# Altium footprint library EPCOS.PcbLib: 178 footprints (part 5 of 12)
Each footprint in its own frame and in the unit in brackets; x right, y up, seen from the top. Pads: shape width x height; smd on the part's side, far side on the other; paste and mask are expansions set on the pad; w line width, h text height; cw(c..) or ccw(c..) is an arc to the next point about the centre after c.
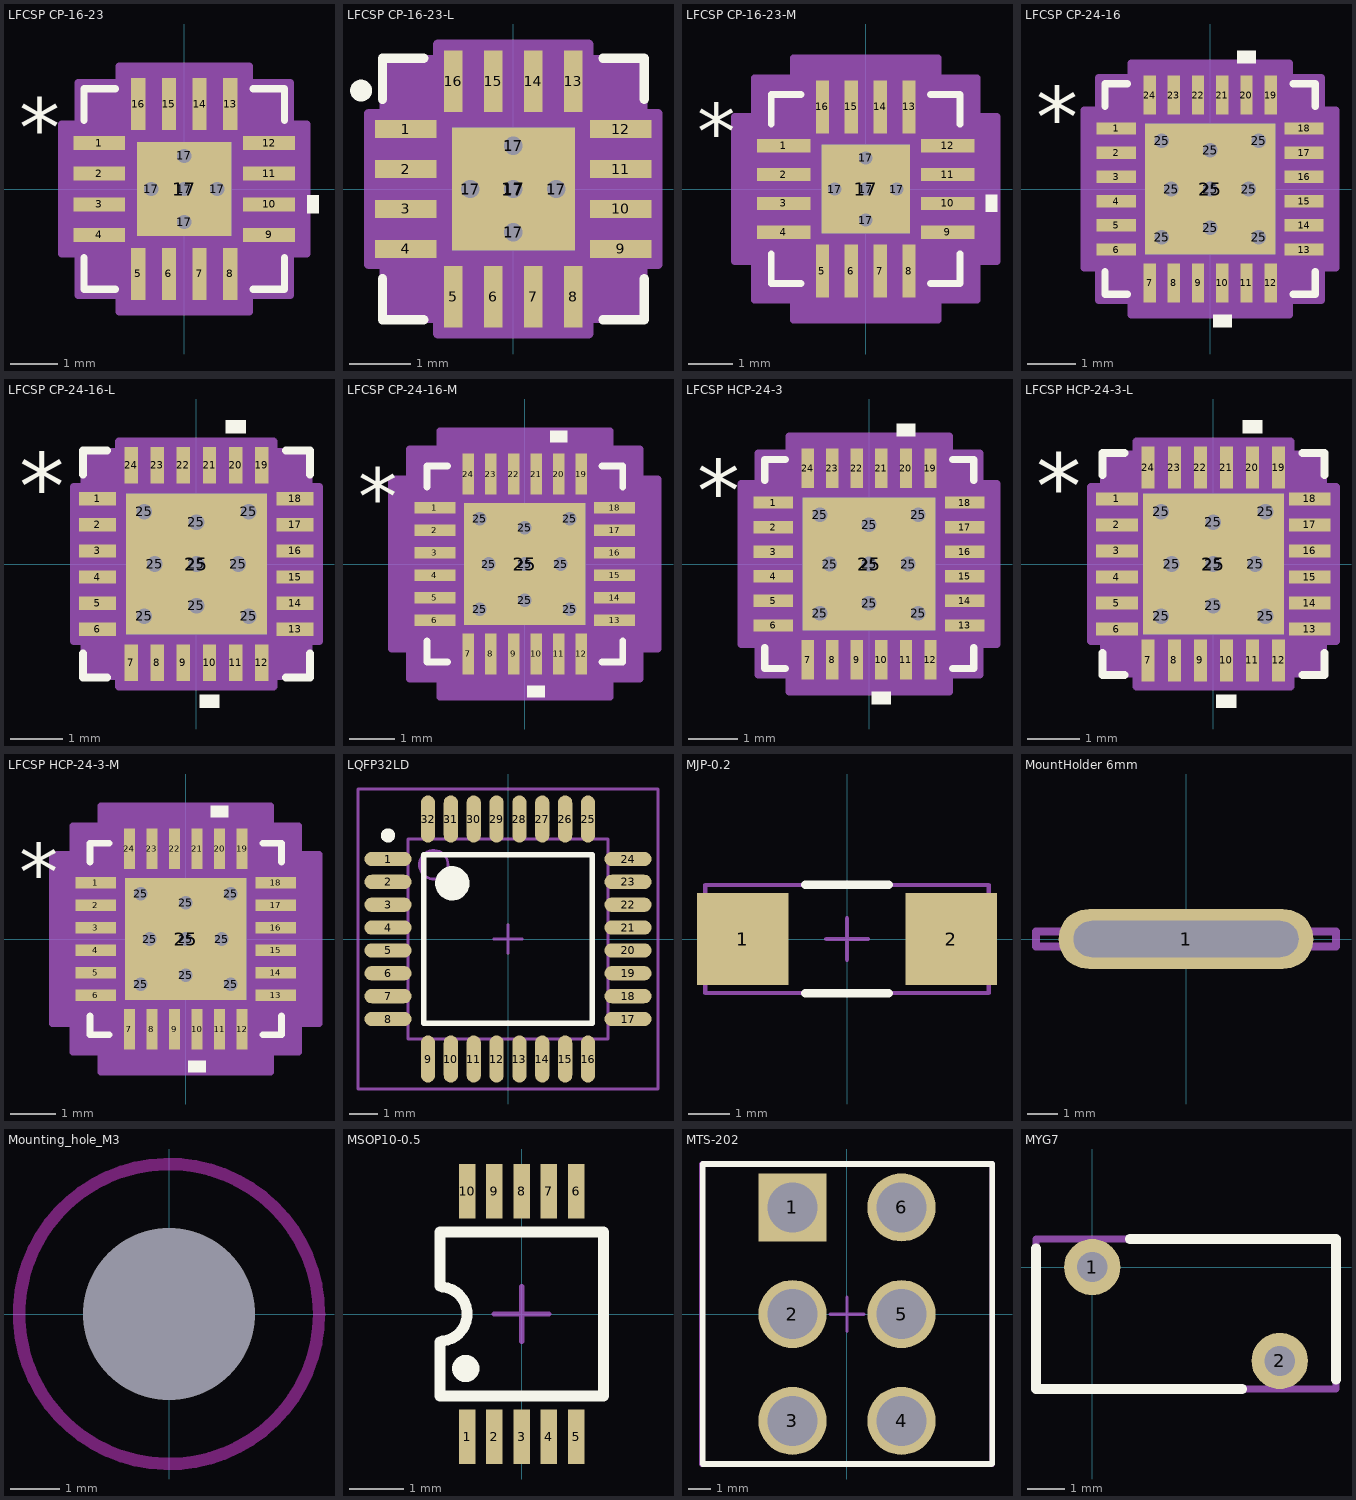
[diagram p4: the footprints below, top view; thin cyan lines are the x and y axes]

## LFCSP CP-16-23 [mm]
height 0.75
pads (22):
  rect 1.1x0.3 smd paste+0 mask+0: 1(-1.8,0.975) 2(-1.8,0.325) 3(-1.8,-0.325) 4(-1.8,-0.975) 9(1.8,-0.975) 10(1.8,-0.325) 11(1.8,0.325) 12(1.8,0.975)
  rect 0.3x1.1 smd paste+0 mask+0: 5(-0.975,-1.8) 6(-0.325,-1.8) 7(0.325,-1.8) 8(0.975,-1.8) 13(0.975,1.8) 14(0.325,1.8) 15(-0.325,1.8) 16(-0.975,1.8)
  round 0.4 hole 0.3 mask+0: 17(-0.7,0) 17(0,-0.7) 17(0,0) 17(0,0.7) 17(0.7,0)
  rect 2x2 smd paste+0 mask+0: 17(0,0)
Bottom Layer:
  rectangle: -1,-1 1,1
Top Overlay:
  region: 2.604,-0.135 2.858,-0.135 2.858,-0.516 2.604,-0.516
  lines w0.152: -2.127,-1.458 -2.127,-2.127 -1.458,-2.127 ; -2.127,1.458 -2.127,2.127 -1.458,2.127 ; 1.458,-2.127 2.127,-2.127 2.127,-1.458 ; 1.458,2.127 2.127,2.127 2.127,1.458
  text "*" at -3.502,0.665 h1.27
Mechanical 13:
  lines w0.025: -2,0.73 -0.73,2 ; -2.05,-1.15 -2.05,-0.8 -2,-0.8 -2,-1.15 -2.05,-1.15 ; -2.05,-0.5 -2.05,-0.15 -2,-0.15 -2,-0.5 -2.05,-0.5 ; -2.05,0.15 -2.05,0.5 -2,0.5 -2,0.15 -2.05,0.15 ; -2.05,0.8 -2.05,1.15 -2,1.15 -2,0.8 -2.05,0.8 ; -2,-2 2,-2 2,2 -2,2 -2,-2 ; -1.15,-2.05 -1.15,-2 -0.8,-2 -0.8,-2.05 -1.15,-2.05 ; -1.15,2 -0.8,2 -0.8,2.05 -1.15,2.05 -1.15,2 ; -0.5,-2.05 -0.5,-2 -0.15,-2 -0.15,-2.05 -0.5,-2.05 ; -0.5,2 -0.15,2 -0.15,2.05 -0.5,2.05 -0.5,2 ; 0.15,-2.05 0.15,-2 0.5,-2 0.5,-2.05 0.15,-2.05 ; 0.15,2 0.5,2 0.5,2.05 0.15,2.05 0.15,2 ; 0.8,-2.05 0.8,-2 1.15,-2 1.15,-2.05 0.8,-2.05 ; 0.8,2 1.15,2 1.15,2.05 0.8,2.05 0.8,2 ; 2,-1.15 2,-0.8 2.05,-0.8 2.05,-1.15 2,-1.15 ; 2,-0.5 2,-0.15 2.05,-0.15 2.05,-0.5 2,-0.5 ; 2,0.15 2,0.5 2.05,0.5 2.05,0.15 2,0.15 ; 2,0.8 2,1.15 2.05,1.15 2.05,0.8 2,0.8
  text "*" at -1.568,0.665 h1.27
Mechanical 15:
  region: -1.379,-2.254 -2.254,-2.254 -2.254,-1.379 -2.604,-1.379 -2.604,1.379 -2.254,1.379 -2.254,2.254 -1.379,2.254 -1.379,2.604 1.379,2.604 1.379,2.254 2.254,2.254 2.254,1.379 2.604,1.379 2.604,-1.379 2.254,-1.379 2.254,-2.254 1.379,-2.254 1.379,-2.604 -1.379,-2.604
  lines w0.152: -2.604,-1.379 -2.254,-1.379 -2.254,-2.254 -1.379,-2.254 -1.379,-2.604 1.379,-2.604 1.379,-2.254 2.254,-2.254 2.254,-1.379 2.604,-1.379 2.604,1.379 2.254,1.379 2.254,2.254 1.379,2.254 1.379,2.604 -1.379,2.604 -1.379,2.254 -2.254,2.254 -2.254,1.379 -2.604,1.379 -2.604,-1.379
3D body: height 0.25, standoff 0, extent 0,0 0.254,0.254
3D body "CP_16_23_ADI.step": height 0.75, standoff 0, extent -2.05,-2.05 2.05,2.05

## LFCSP CP-16-23-L [mm]
height 0.75
pads (22):
  rect 1x0.3 smd paste+0 mask+0: 1(-1.75,0.975) 2(-1.75,0.325) 3(-1.75,-0.325) 4(-1.75,-0.975) 9(1.75,-0.975) 10(1.75,-0.325) 11(1.75,0.325) 12(1.75,0.975)
  rect 0.3x1 smd paste+0 mask+0: 5(-0.975,-1.75) 6(-0.325,-1.75) 7(0.325,-1.75) 8(0.975,-1.75) 13(0.975,1.75) 14(0.325,1.75) 15(-0.325,1.75) 16(-0.975,1.75)
  round 0.4 hole 0.3 mask+0: 17(-0.7,0) 17(0,-0.7) 17(0,0) 17(0,0.7) 17(0.7,0)
  rect 2x2 smd paste+0 mask+0: 17(0,0)
Bottom Layer:
  rectangle: -1,-1 1,1
Top Overlay:
  circle w0.254: c-2.475,1.6 r0.05
  lines w0.152: -2.127,-1.458 -2.127,-2.127 -1.458,-2.127 ; -2.127,1.458 -2.127,2.127 -1.458,2.127 ; 1.458,-2.127 2.127,-2.127 2.127,-1.458 ; 1.458,2.127 2.127,2.127 2.127,1.458
Mechanical 13:
  lines w0.025: -2,0.73 -0.73,2 ; -2.05,-1.15 -2,-1.15 -2,-0.8 -2.05,-0.8 -2.05,-1.15 ; -2.05,-0.5 -2,-0.5 -2,-0.15 -2.05,-0.15 -2.05,-0.5 ; -2.05,0.15 -2,0.15 -2,0.5 -2.05,0.5 -2.05,0.15 ; -2.05,0.8 -2,0.8 -2,1.15 -2.05,1.15 -2.05,0.8 ; -2,-2 -2,2 2,2 2,-2 -2,-2 ; -1.15,-2.05 -0.8,-2.05 -0.8,-2 -1.15,-2 -1.15,-2.05 ; -1.15,2 -1.15,2.05 -0.8,2.05 -0.8,2 -1.15,2 ; -0.5,-2.05 -0.15,-2.05 -0.15,-2 -0.5,-2 -0.5,-2.05 ; -0.5,2 -0.5,2.05 -0.15,2.05 -0.15,2 -0.5,2 ; 0.15,-2.05 0.5,-2.05 0.5,-2 0.15,-2 0.15,-2.05 ; 0.15,2 0.15,2.05 0.5,2.05 0.5,2 0.15,2 ; 0.8,-2.05 1.15,-2.05 1.15,-2 0.8,-2 0.8,-2.05 ; 0.8,2 0.8,2.05 1.15,2.05 1.15,2 0.8,2 ; 2,-1.15 2.05,-1.15 2.05,-0.8 2,-0.8 2,-1.15 ; 2,-0.5 2.05,-0.5 2.05,-0.15 2,-0.15 2,-0.5 ; 2,0.15 2.05,0.15 2.05,0.5 2,0.5 2,0.15 ; 2,0.8 2.05,0.8 2.05,1.15 2,1.15 2,0.8
  text "*" at -1.568,0.665 h1.27
Mechanical 15:
  region: -1.227,-2.102 -2.102,-2.102 -2.102,-1.227 -2.352,-1.227 -2.352,1.227 -2.102,1.227 -2.102,2.102 -1.227,2.102 -1.227,2.352 1.227,2.352 1.227,2.102 2.102,2.102 2.102,1.227 2.352,1.227 2.352,-1.227 2.102,-1.227 2.102,-2.102 1.227,-2.102 1.227,-2.352 -1.227,-2.352
  lines w0.152: -2.352,-1.227 -2.352,1.227 -2.102,1.227 -2.102,2.102 -1.227,2.102 -1.227,2.352 1.227,2.352 1.227,2.102 2.102,2.102 2.102,1.227 2.352,1.227 2.352,-1.227 2.102,-1.227 2.102,-2.102 1.227,-2.102 1.227,-2.352 -1.227,-2.352 -1.227,-2.102 -2.102,-2.102 -2.102,-1.227 -2.352,-1.227
3D body: height 0.25, standoff 0, extent 0,0 0.254,0.254
3D body "CP_16_23_ADI-L.step": height 0.75, standoff 0, extent -2.05,-2.05 2.05,2.05

## LFCSP CP-16-23-M [mm]
height 0.75
pads (22):
  rect 1.2x0.3 smd paste+0 mask+0: 1(-1.85,0.975) 2(-1.85,0.325) 3(-1.85,-0.325) 4(-1.85,-0.975) 9(1.85,-0.975) 10(1.85,-0.325) 11(1.85,0.325) 12(1.85,0.975)
  rect 0.3x1.2 smd paste+0 mask+0: 5(-0.975,-1.85) 6(-0.325,-1.85) 7(0.325,-1.85) 8(0.975,-1.85) 13(0.975,1.85) 14(0.325,1.85) 15(-0.325,1.85) 16(-0.975,1.85)
  round 0.4 hole 0.3 mask+0: 17(-0.7,0) 17(0,-0.7) 17(0,0) 17(0,0.7) 17(0.7,0)
  rect 2x2 smd paste+0 mask+0: 17(0,0)
Bottom Layer:
  rectangle: -1,-1 1,1
Top Overlay:
  region: 2.704,-0.135 2.958,-0.135 2.958,-0.516 2.704,-0.516
  lines w0.152: -2.127,-1.458 -2.127,-2.127 -1.458,-2.127 ; -2.127,1.458 -2.127,2.127 -1.458,2.127 ; 1.458,-2.127 2.127,-2.127 2.127,-1.458 ; 1.458,2.127 2.127,2.127 2.127,1.458
  text "*" at -3.802,0.665 h1.27
Mechanical 13:
  lines w0.025: -2,0.73 -0.73,2 ; -2.05,-1.15 -2.05,-0.8 -2,-0.8 -2,-1.15 -2.05,-1.15 ; -2.05,-0.5 -2.05,-0.15 -2,-0.15 -2,-0.5 -2.05,-0.5 ; -2.05,0.15 -2.05,0.5 -2,0.5 -2,0.15 -2.05,0.15 ; -2.05,0.8 -2.05,1.15 -2,1.15 -2,0.8 -2.05,0.8 ; -2,-2 2,-2 2,2 -2,2 -2,-2 ; -1.15,-2.05 -1.15,-2 -0.8,-2 -0.8,-2.05 -1.15,-2.05 ; -1.15,2 -0.8,2 -0.8,2.05 -1.15,2.05 -1.15,2 ; -0.5,-2.05 -0.5,-2 -0.15,-2 -0.15,-2.05 -0.5,-2.05 ; -0.5,2 -0.15,2 -0.15,2.05 -0.5,2.05 -0.5,2 ; 0.15,-2.05 0.15,-2 0.5,-2 0.5,-2.05 0.15,-2.05 ; 0.15,2 0.5,2 0.5,2.05 0.15,2.05 0.15,2 ; 0.8,-2.05 0.8,-2 1.15,-2 1.15,-2.05 0.8,-2.05 ; 0.8,2 1.15,2 1.15,2.05 0.8,2.05 0.8,2 ; 2,-1.15 2,-0.8 2.05,-0.8 2.05,-1.15 2,-1.15 ; 2,-0.5 2,-0.15 2.05,-0.15 2.05,-0.5 2,-0.5 ; 2,0.15 2,0.5 2.05,0.5 2.05,0.15 2,0.15 ; 2,0.8 2,1.15 2.05,1.15 2.05,0.8 2,0.8
  text "*" at -1.568,0.665 h1.27
Mechanical 15:
  region: -1.633,-2.508 -2.508,-2.508 -2.508,-1.633 -2.958,-1.633 -2.958,1.633 -2.508,1.633 -2.508,2.508 -1.633,2.508 -1.633,2.958 1.633,2.958 1.633,2.508 2.508,2.508 2.508,1.633 2.958,1.633 2.958,-1.633 2.508,-1.633 2.508,-2.508 1.633,-2.508 1.633,-2.958 -1.633,-2.958
  lines w0.152: -2.958,-1.633 -2.508,-1.633 -2.508,-2.508 -1.633,-2.508 -1.633,-2.958 1.633,-2.958 1.633,-2.508 2.508,-2.508 2.508,-1.633 2.958,-1.633 2.958,1.633 2.508,1.633 2.508,2.508 1.633,2.508 1.633,2.958 -1.633,2.958 -1.633,2.508 -2.508,2.508 -2.508,1.633 -2.958,1.633 -2.958,-1.633
3D body "CP_16_23_ADI-M.step": height 0.75, standoff 0, extent -2.05,-2.05 2.05,2.05
3D body: height 0.25, standoff 0, extent 0,0 0.254,0.254

## LFCSP CP-24-16 [mm]
height 0.85
pads (34):
  rect 0.808x0.255 smd paste+0 mask+0: 1(-1.941,1.25) 2(-1.941,0.75) 3(-1.941,0.25) 4(-1.941,-0.25) 5(-1.941,-0.75) 6(-1.941,-1.25) 13(1.941,-1.25) 14(1.941,-0.75) 15(1.941,-0.25) 16(1.941,0.25) 17(1.941,0.75) 18(1.941,1.25)
  rect 0.255x0.808 smd paste+0 mask+0: 7(-1.25,-1.941) 8(-0.75,-1.941) 9(-0.25,-1.941) 10(0.25,-1.941) 11(0.75,-1.941) 12(1.25,-1.941) 19(1.25,1.941) 20(0.75,1.941) 21(0.25,1.941) 22(-0.25,1.941) 23(-0.75,1.941) 24(-1.25,1.941)
  round 0.4 hole 0.3 mask+0: 25(-1,-1) 25(-1,1) 25(-0.8,0) 25(0,-0.8) 25(0,0) 25(0,0.8) 25(0.8,0) 25(1,-1) 25(1,1)
  rect 2.7x2.7 smd paste-1.41 mask+0: 25(0,0)
Bottom Layer:
  rectangle: -1.35,-1.35 1.35,1.35
Top Overlay:
  region: 0.941,2.599 0.56,2.599 0.56,2.853 0.941,2.853
  region: 0.44,-2.599 0.059,-2.599 0.059,-2.853 0.44,-2.853
  lines w0.152: -2.172,-1.71 -2.172,-2.172 -1.71,-2.172 ; -2.172,1.71 -2.172,2.172 -1.71,2.172 ; 1.71,-2.172 2.172,-2.172 2.172,-1.71 ; 1.71,2.172 2.172,2.172 2.172,1.71
  text "*" at -3.597,0.865 h1.27
Top Paste:
  region: 1.322,-0.1 0.1,-0.1 0.1,-1.322 1.322,-1.322
  region: 1.322,1.322 0.1,1.322 0.1,0.1 1.322,0.1
  region: -0.1,-0.1 -1.322,-0.1 -1.322,-1.322 -0.1,-1.322
  region: -0.1,1.322 -1.322,1.322 -1.322,0.1 -0.1,0.1
Mechanical 13:
  lines w0.025: -2.045,0.775 -0.775,2.045 ; -2.045,-2.045 -2.045,2.045 2.045,2.045 2.045,-2.045 -2.045,-2.045 ; -2.045,-1.402 -2.045,-1.098 -2.045,-1.402 ; -2.045,-0.902 -2.045,-0.598 -2.045,-0.902 ; -2.045,-0.402 -2.045,-0.098 -2.045,-0.402 ; -2.045,0.098 -2.045,0.402 -2.045,0.098 ; -2.045,0.598 -2.045,0.902 -2.045,0.598 ; -2.045,1.098 -2.045,1.402 -2.045,1.098 ; -1.402,-2.045 -1.098,-2.045 -1.402,-2.045 ; -1.402,2.045 -1.098,2.045 -1.402,2.045 ; -0.902,-2.045 -0.598,-2.045 -0.902,-2.045 ; -0.902,2.045 -0.598,2.045 -0.902,2.045 ; -0.402,-2.045 -0.098,-2.045 -0.402,-2.045 ; -0.402,2.045 -0.098,2.045 -0.402,2.045 ; 0.098,-2.045 0.402,-2.045 0.098,-2.045 ; 0.098,2.045 0.402,2.045 0.098,2.045 ; 0.598,-2.045 0.902,-2.045 0.598,-2.045 ; 0.598,2.045 0.902,2.045 0.598,2.045 ; 1.098,-2.045 1.402,-2.045 1.098,-2.045 ; 1.098,2.045 1.402,2.045 1.098,2.045 ; 2.045,-1.402 2.045,-1.098 2.045,-1.402 ; 2.045,-0.902 2.045,-0.598 2.045,-0.902 ; 2.045,-0.402 2.045,-0.098 2.045,-0.402 ; 2.045,0.098 2.045,0.402 2.045,0.098 ; 2.045,0.598 2.045,0.902 2.045,0.598 ; 2.045,1.098 2.045,1.402 2.045,1.098
  text "*" at -1.854,0.865 h1.27
Mechanical 15:
  region: -1.631,-2.299 -2.299,-2.299 -2.299,-1.631 -2.599,-1.631 -2.599,1.631 -2.299,1.631 -2.299,2.299 -1.631,2.299 -1.631,2.599 1.631,2.599 1.631,2.299 2.299,2.299 2.299,1.631 2.599,1.631 2.599,-1.631 2.299,-1.631 2.299,-2.299 1.631,-2.299 1.631,-2.599 -1.631,-2.599
  lines w0.152: -2.599,-1.631 -2.599,1.631 -2.299,1.631 -2.299,2.299 -1.631,2.299 -1.631,2.599 1.631,2.599 1.631,2.299 2.299,2.299 2.299,1.631 2.599,1.631 2.599,-1.631 2.299,-1.631 2.299,-2.299 1.631,-2.299 1.631,-2.599 -1.631,-2.599 -1.631,-2.299 -2.299,-2.299 -2.299,-1.631 -2.599,-1.631
3D body: height 0.25, standoff 0, extent 0,0 0.254,0.254
3D body "LFCSP24_HMC321ALP4E_ADI.step": height 0.87, standoff 0, extent -2.045,-2.045 2.045,2.045

## LFCSP CP-24-16-L [mm]
height 0.85
pads (34):
  rect 0.708x0.255 smd paste+0 mask+0: 1(-1.891,1.25) 2(-1.891,0.75) 3(-1.891,0.25) 4(-1.891,-0.25) 5(-1.891,-0.75) 6(-1.891,-1.25) 13(1.891,-1.25) 14(1.891,-0.75) 15(1.891,-0.25) 16(1.891,0.25) 17(1.891,0.75) 18(1.891,1.25)
  rect 0.255x0.708 smd paste+0 mask+0: 7(-1.25,-1.891) 8(-0.75,-1.891) 9(-0.25,-1.891) 10(0.25,-1.891) 11(0.75,-1.891) 12(1.25,-1.891) 19(1.25,1.891) 20(0.75,1.891) 21(0.25,1.891) 22(-0.25,1.891) 23(-0.75,1.891) 24(-1.25,1.891)
  round 0.4 hole 0.3 mask+0: 25(-1,-1) 25(-1,1) 25(-0.8,0) 25(0,-0.8) 25(0,0) 25(0,0.8) 25(0.8,0) 25(1,-1) 25(1,1)
  rect 2.7x2.7 smd paste-1.41 mask+0: 25(0,0)
Bottom Layer:
  rectangle: -1.35,-1.35 1.35,1.35
Top Overlay:
  region: 0.44,-2.499 0.059,-2.499 0.059,-2.753 0.44,-2.753
  region: 0.941,2.499 0.56,2.499 0.56,2.753 0.941,2.753
  lines w0.152: -2.172,-1.71 -2.172,-2.172 -1.71,-2.172 ; -2.172,1.71 -2.172,2.172 -1.71,2.172 ; 1.71,-2.172 2.172,-2.172 2.172,-1.71 ; 1.71,2.172 2.172,2.172 2.172,1.71
  text "*" at -3.397,0.865 h1.27
Top Paste:
  region: -0.1,1.322 -1.322,1.322 -1.322,0.1 -0.1,0.1
  region: -0.1,-0.1 -1.322,-0.1 -1.322,-1.322 -0.1,-1.322
  region: 1.322,1.322 0.1,1.322 0.1,0.1 1.322,0.1
  region: 1.322,-0.1 0.1,-0.1 0.1,-1.322 1.322,-1.322
Mechanical 13:
  lines w0.025: -2.045,0.775 -0.775,2.045 ; -2.045,-2.045 2.045,-2.045 2.045,2.045 -2.045,2.045 -2.045,-2.045 ; -2.045,-1.402 -2.045,-1.098 -2.045,-1.402 ; -2.045,-0.902 -2.045,-0.598 -2.045,-0.902 ; -2.045,-0.402 -2.045,-0.098 -2.045,-0.402 ; -2.045,0.098 -2.045,0.402 -2.045,0.098 ; -2.045,0.598 -2.045,0.902 -2.045,0.598 ; -2.045,1.098 -2.045,1.402 -2.045,1.098 ; -1.402,-2.045 -1.098,-2.045 -1.402,-2.045 ; -1.402,2.045 -1.098,2.045 -1.402,2.045 ; -0.902,-2.045 -0.598,-2.045 -0.902,-2.045 ; -0.902,2.045 -0.598,2.045 -0.902,2.045 ; -0.402,-2.045 -0.098,-2.045 -0.402,-2.045 ; -0.402,2.045 -0.098,2.045 -0.402,2.045 ; 0.098,-2.045 0.402,-2.045 0.098,-2.045 ; 0.098,2.045 0.402,2.045 0.098,2.045 ; 0.598,-2.045 0.902,-2.045 0.598,-2.045 ; 0.598,2.045 0.902,2.045 0.598,2.045 ; 1.098,-2.045 1.402,-2.045 1.098,-2.045 ; 1.098,2.045 1.402,2.045 1.098,2.045 ; 2.045,-1.402 2.045,-1.098 2.045,-1.402 ; 2.045,-0.902 2.045,-0.598 2.045,-0.902 ; 2.045,-0.402 2.045,-0.098 2.045,-0.402 ; 2.045,0.098 2.045,0.402 2.045,0.098 ; 2.045,0.598 2.045,0.902 2.045,0.598 ; 2.045,1.098 2.045,1.402 2.045,1.098
  text "*" at -1.854,0.865 h1.27
Mechanical 15:
  region: -1.479,-2.146 -2.146,-2.146 -2.146,-1.479 -2.346,-1.479 -2.346,1.479 -2.146,1.479 -2.146,2.146 -1.479,2.146 -1.479,2.346 1.479,2.346 1.479,2.146 2.146,2.146 2.146,1.479 2.346,1.479 2.346,-1.479 2.146,-1.479 2.146,-2.146 1.479,-2.146 1.479,-2.346 -1.479,-2.346
  lines w0.152: -2.346,-1.479 -2.146,-1.479 -2.146,-2.146 -1.479,-2.146 -1.479,-2.346 1.479,-2.346 1.479,-2.146 2.146,-2.146 2.146,-1.479 2.346,-1.479 2.346,1.479 2.146,1.479 2.146,2.146 1.479,2.146 1.479,2.346 -1.479,2.346 -1.479,2.146 -2.146,2.146 -2.146,1.479 -2.346,1.479 -2.346,-1.479
3D body: height 0.25, standoff 0, extent 0,0 0.254,0.254
3D body "LFCSP24_HMC321ALP4E_ADI-L.step": height 0.87, standoff 0, extent -2.045,-2.045 2.045,2.045

## LFCSP CP-24-16-M [mm]
height 0.85
pads (34):
  rect 0.908x0.255 smd paste+0 mask+0: 1(-1.991,1.25) 2(-1.991,0.75) 3(-1.991,0.25) 4(-1.991,-0.25) 5(-1.991,-0.75) 6(-1.991,-1.25) 13(1.991,-1.25) 14(1.991,-0.75) 15(1.991,-0.25) 16(1.991,0.25) 17(1.991,0.75) 18(1.991,1.25)
  rect 0.255x0.908 smd paste+0 mask+0: 7(-1.25,-1.991) 8(-0.75,-1.991) 9(-0.25,-1.991) 10(0.25,-1.991) 11(0.75,-1.991) 12(1.25,-1.991) 19(1.25,1.991) 20(0.75,1.991) 21(0.25,1.991) 22(-0.25,1.991) 23(-0.75,1.991) 24(-1.25,1.991)
  round 0.4 hole 0.3 mask+0: 25(-1,-1) 25(-1,1) 25(-0.8,0) 25(0,-0.8) 25(0,0) 25(0,0.8) 25(0.8,0) 25(1,-1) 25(1,1)
  rect 2.7x2.7 smd paste-1.41 mask+0: 25(0,0)
Bottom Layer:
  rectangle: -1.35,-1.35 1.35,1.35
Top Overlay:
  region: 0.44,-2.699 0.059,-2.699 0.059,-2.953 0.44,-2.953
  region: 0.941,2.699 0.56,2.699 0.56,2.953 0.941,2.953
  lines w0.152: -2.172,-1.71 -2.172,-2.172 -1.71,-2.172 ; -2.172,1.71 -2.172,2.172 -1.71,2.172 ; 1.71,-2.172 2.172,-2.172 2.172,-1.71 ; 1.71,2.172 2.172,2.172 2.172,1.71
  text "*" at -3.697,0.865 h1.27
Top Paste:
  region: -0.1,1.322 -1.322,1.322 -1.322,0.1 -0.1,0.1
  region: -0.1,-0.1 -1.322,-0.1 -1.322,-1.322 -0.1,-1.322
  region: 1.322,1.322 0.1,1.322 0.1,0.1 1.322,0.1
  region: 1.322,-0.1 0.1,-0.1 0.1,-1.322 1.322,-1.322
Mechanical 13:
  lines w0.025: -2.045,0.775 -0.775,2.045 ; -2.045,-2.045 2.045,-2.045 2.045,2.045 -2.045,2.045 -2.045,-2.045 ; -2.045,-1.402 -2.045,-1.098 -2.045,-1.402 ; -2.045,-0.902 -2.045,-0.598 -2.045,-0.902 ; -2.045,-0.402 -2.045,-0.098 -2.045,-0.402 ; -2.045,0.098 -2.045,0.402 -2.045,0.098 ; -2.045,0.598 -2.045,0.902 -2.045,0.598 ; -2.045,1.098 -2.045,1.402 -2.045,1.098 ; -1.402,-2.045 -1.098,-2.045 -1.402,-2.045 ; -1.402,2.045 -1.098,2.045 -1.402,2.045 ; -0.902,-2.045 -0.598,-2.045 -0.902,-2.045 ; -0.902,2.045 -0.598,2.045 -0.902,2.045 ; -0.402,-2.045 -0.098,-2.045 -0.402,-2.045 ; -0.402,2.045 -0.098,2.045 -0.402,2.045 ; 0.098,-2.045 0.402,-2.045 0.098,-2.045 ; 0.098,2.045 0.402,2.045 0.098,2.045 ; 0.598,-2.045 0.902,-2.045 0.598,-2.045 ; 0.598,2.045 0.902,2.045 0.598,2.045 ; 1.098,-2.045 1.402,-2.045 1.098,-2.045 ; 1.098,2.045 1.402,2.045 1.098,2.045 ; 2.045,-1.402 2.045,-1.098 2.045,-1.402 ; 2.045,-0.902 2.045,-0.598 2.045,-0.902 ; 2.045,-0.402 2.045,-0.098 2.045,-0.402 ; 2.045,0.098 2.045,0.402 2.045,0.098 ; 2.045,0.598 2.045,0.902 2.045,0.598 ; 2.045,1.098 2.045,1.402 2.045,1.098
  text "*" at -1.854,0.865 h1.27
Mechanical 15:
  region: -1.885,-2.553 -2.553,-2.553 -2.553,-1.885 -2.953,-1.885 -2.953,1.885 -2.553,1.885 -2.553,2.553 -1.885,2.553 -1.885,2.953 1.885,2.953 1.885,2.553 2.553,2.553 2.553,1.885 2.953,1.885 2.953,-1.885 2.553,-1.885 2.553,-2.553 1.885,-2.553 1.885,-2.953 -1.885,-2.953
  lines w0.152: -2.953,-1.885 -2.553,-1.885 -2.553,-2.553 -1.885,-2.553 -1.885,-2.953 1.885,-2.953 1.885,-2.553 2.553,-2.553 2.553,-1.885 2.953,-1.885 2.953,1.885 2.553,1.885 2.553,2.553 1.885,2.553 1.885,2.953 -1.885,2.953 -1.885,2.553 -2.553,2.553 -2.553,1.885 -2.953,1.885 -2.953,-1.885
3D body: height 0.25, standoff 0, extent 0,0 0.254,0.254
3D body "LFCSP24_HMC321ALP4E_ADI-M.step": height 0.87, standoff 0, extent -2.045,-2.045 2.045,2.045

## LFCSP HCP-24-3 [mm]
height 0.85
pads (34):
  rect 0.8x0.25 smd paste+0 mask+0: 1(-1.95,1.25) 2(-1.95,0.75) 3(-1.95,0.25) 4(-1.95,-0.25) 5(-1.95,-0.75) 6(-1.95,-1.25) 13(1.95,-1.25) 14(1.95,-0.75) 15(1.95,-0.25) 16(1.95,0.25) 17(1.95,0.75) 18(1.95,1.25)
  rect 0.25x0.8 smd paste+0 mask+0: 7(-1.25,-1.95) 8(-0.75,-1.95) 9(-0.25,-1.95) 10(0.25,-1.95) 11(0.75,-1.95) 12(1.25,-1.95) 19(1.25,1.95) 20(0.75,1.95) 21(0.25,1.95) 22(-0.25,1.95) 23(-0.75,1.95) 24(-1.25,1.95)
  round 0.4 hole 0.3 mask+0: 25(-1,-1) 25(-1,1) 25(-0.8,0) 25(0,-0.8) 25(0,0) 25(0,0.8) 25(0.8,0) 25(1,-1) 25(1,1)
  rect 2.7x2.7 smd paste-1.337 mask+0: 25(0,0)
Bottom Layer:
  rectangle: -1.35,-1.35 1.35,1.35
Top Overlay:
  region: 0.941,2.604 0.56,2.604 0.56,2.858 0.941,2.858
  region: 0.44,-2.604 0.059,-2.604 0.059,-2.858 0.44,-2.858
  lines w0.152: -2.127,-1.708 -2.127,-2.127 -1.708,-2.127 ; -2.127,1.708 -2.127,2.127 -1.708,2.127 ; 1.708,-2.127 2.127,-2.127 2.127,-1.708 ; 1.708,2.127 2.127,2.127 2.127,1.708
  text "*" at -3.502,0.865 h1.27
Top Paste:
  region: 1.25,-0.1 0.1,-0.1 0.1,-1.25 1.25,-1.25
  region: 1.25,1.25 0.1,1.25 0.1,0.1 1.25,0.1
  region: -0.1,-0.1 -1.25,-0.1 -1.25,-1.25 -0.1,-1.25
  region: -0.1,1.25 -1.25,1.25 -1.25,0.1 -0.1,0.1
Mechanical 13:
  lines w0.025: -2,0.73 -0.73,2 ; -2.05,-1.4 -2,-1.4 -2,-1.1 -2.05,-1.1 -2.05,-1.4 ; -2.05,-0.9 -2,-0.9 -2,-0.6 -2.05,-0.6 -2.05,-0.9 ; -2.05,-0.4 -2,-0.4 -2,-0.1 -2.05,-0.1 -2.05,-0.4 ; -2.05,0.1 -2,0.1 -2,0.4 -2.05,0.4 -2.05,0.1 ; -2.05,0.6 -2,0.6 -2,0.9 -2.05,0.9 -2.05,0.6 ; -2.05,1.1 -2,1.1 -2,1.4 -2.05,1.4 -2.05,1.1 ; -2,-2 -2,2 2,2 2,-2 -2,-2 ; -1.4,-2.05 -1.1,-2.05 -1.1,-2 -1.4,-2 -1.4,-2.05 ; -1.4,2 -1.4,2.05 -1.1,2.05 -1.1,2 -1.4,2 ; -0.9,-2.05 -0.6,-2.05 -0.6,-2 -0.9,-2 -0.9,-2.05 ; -0.9,2 -0.9,2.05 -0.6,2.05 -0.6,2 -0.9,2 ; -0.4,-2.05 -0.1,-2.05 -0.1,-2 -0.4,-2 -0.4,-2.05 ; -0.4,2 -0.4,2.05 -0.1,2.05 -0.1,2 -0.4,2 ; 0.1,-2.05 0.4,-2.05 0.4,-2 0.1,-2 0.1,-2.05 ; 0.1,2 0.1,2.05 0.4,2.05 0.4,2 0.1,2 ; 0.6,-2.05 0.9,-2.05 0.9,-2 0.6,-2 0.6,-2.05 ; 0.6,2 0.6,2.05 0.9,2.05 0.9,2 0.6,2 ; 1.1,-2.05 1.4,-2.05 1.4,-2 1.1,-2 1.1,-2.05 ; 1.1,2 1.1,2.05 1.4,2.05 1.4,2 1.1,2 ; 2,-1.4 2.05,-1.4 2.05,-1.1 2,-1.1 2,-1.4 ; 2,-0.9 2.05,-0.9 2.05,-0.6 2,-0.6 2,-0.9 ; 2,-0.4 2.05,-0.4 2.05,-0.1 2,-0.1 2,-0.4 ; 2,0.1 2.05,0.1 2.05,0.4 2,0.4 2,0.1 ; 2,0.6 2.05,0.6 2.05,0.9 2,0.9 2,0.6 ; 2,1.1 2.05,1.1 2.05,1.4 2,1.4 2,1.1
  text "*" at -1.767,0.865 h1.27
Mechanical 15:
  region: -1.629,-2.254 -2.254,-2.254 -2.254,-1.629 -2.604,-1.629 -2.604,1.629 -2.254,1.629 -2.254,2.254 -1.629,2.254 -1.629,2.604 1.629,2.604 1.629,2.254 2.254,2.254 2.254,1.629 2.604,1.629 2.604,-1.629 2.254,-1.629 2.254,-2.254 1.629,-2.254 1.629,-2.604 -1.629,-2.604
  lines w0.152: -2.604,-1.629 -2.604,1.629 -2.254,1.629 -2.254,2.254 -1.629,2.254 -1.629,2.604 1.629,2.604 1.629,2.254 2.254,2.254 2.254,1.629 2.604,1.629 2.604,-1.629 2.254,-1.629 2.254,-2.254 1.629,-2.254 1.629,-2.604 -1.629,-2.604 -1.629,-2.254 -2.254,-2.254 -2.254,-1.629 -2.604,-1.629
3D body "HCP_24_3_ADI.step": height 0.85, standoff 0, extent -2.05,-2.05 2.05,2.05
3D body: height 0.25, standoff 0, extent 0,0 0.254,0.254

## LFCSP HCP-24-3-L [mm]
height 0.85
pads (34):
  rect 0.8x0.25 smd paste+0 mask+0: 1(-1.85,1.25) 2(-1.85,0.75) 3(-1.85,0.25) 4(-1.85,-0.25) 5(-1.85,-0.75) 6(-1.85,-1.25) 13(1.85,-1.25) 14(1.85,-0.75) 15(1.85,-0.25) 16(1.85,0.25) 17(1.85,0.75) 18(1.85,1.25)
  rect 0.25x0.8 smd paste+0 mask+0: 7(-1.25,-1.85) 8(-0.75,-1.85) 9(-0.25,-1.85) 10(0.25,-1.85) 11(0.75,-1.85) 12(1.25,-1.85) 19(1.25,1.85) 20(0.75,1.85) 21(0.25,1.85) 22(-0.25,1.85) 23(-0.75,1.85) 24(-1.25,1.85)
  round 0.4 hole 0.3 mask+0: 25(-1,-1) 25(-1,1) 25(-0.8,0) 25(0,-0.8) 25(0,0) 25(0,0.8) 25(0.8,0) 25(1,-1) 25(1,1)
  rect 2.7x2.7 smd paste-1.337 mask+0: 25(0,0)
Bottom Layer:
  rectangle: -1.35,-1.35 1.35,1.35
Top Overlay:
  region: 0.44,-2.504 0.059,-2.504 0.059,-2.758 0.44,-2.758
  region: 0.941,2.504 0.56,2.504 0.56,2.758 0.941,2.758
  lines w0.152: -2.127,-1.708 -2.127,-2.127 -1.708,-2.127 ; -2.127,1.708 -2.127,2.127 -1.708,2.127 ; 1.708,-2.127 2.127,-2.127 2.127,-1.708 ; 1.708,2.127 2.127,2.127 2.127,1.708
  text "*" at -3.403,0.865 h1.27
Top Paste:
  region: -0.1,1.25 -1.25,1.25 -1.25,0.1 -0.1,0.1
  region: -0.1,-0.1 -1.25,-0.1 -1.25,-1.25 -0.1,-1.25
  region: 1.25,1.25 0.1,1.25 0.1,0.1 1.25,0.1
  region: 1.25,-0.1 0.1,-0.1 0.1,-1.25 1.25,-1.25
Mechanical 13:
  lines w0.025: -2,0.73 -0.73,2 ; -2.05,-1.4 -2.05,-1.1 -2,-1.1 -2,-1.4 -2.05,-1.4 ; -2.05,-0.9 -2.05,-0.6 -2,-0.6 -2,-0.9 -2.05,-0.9 ; -2.05,-0.4 -2.05,-0.1 -2,-0.1 -2,-0.4 -2.05,-0.4 ; -2.05,0.1 -2.05,0.4 -2,0.4 -2,0.1 -2.05,0.1 ; -2.05,0.6 -2.05,0.9 -2,0.9 -2,0.6 -2.05,0.6 ; -2.05,1.1 -2.05,1.4 -2,1.4 -2,1.1 -2.05,1.1 ; -2,-2 2,-2 2,2 -2,2 -2,-2 ; -1.4,-2.05 -1.4,-2 -1.1,-2 -1.1,-2.05 -1.4,-2.05 ; -1.4,2 -1.1,2 -1.1,2.05 -1.4,2.05 -1.4,2 ; -0.9,-2.05 -0.9,-2 -0.6,-2 -0.6,-2.05 -0.9,-2.05 ; -0.9,2 -0.6,2 -0.6,2.05 -0.9,2.05 -0.9,2 ; -0.4,-2.05 -0.4,-2 -0.1,-2 -0.1,-2.05 -0.4,-2.05 ; -0.4,2 -0.1,2 -0.1,2.05 -0.4,2.05 -0.4,2 ; 0.1,-2.05 0.1,-2 0.4,-2 0.4,-2.05 0.1,-2.05 ; 0.1,2 0.4,2 0.4,2.05 0.1,2.05 0.1,2 ; 0.6,-2.05 0.6,-2 0.9,-2 0.9,-2.05 0.6,-2.05 ; 0.6,2 0.9,2 0.9,2.05 0.6,2.05 0.6,2 ; 1.1,-2.05 1.1,-2 1.4,-2 1.4,-2.05 1.1,-2.05 ; 1.1,2 1.4,2 1.4,2.05 1.1,2.05 1.1,2 ; 2,-1.4 2,-1.1 2.05,-1.1 2.05,-1.4 2,-1.4 ; 2,-0.9 2,-0.6 2.05,-0.6 2.05,-0.9 2,-0.9 ; 2,-0.4 2,-0.1 2.05,-0.1 2.05,-0.4 2,-0.4 ; 2,0.1 2,0.4 2.05,0.4 2.05,0.1 2,0.1 ; 2,0.6 2,0.9 2.05,0.9 2.05,0.6 2,0.6 ; 2,1.1 2,1.4 2.05,1.4 2.05,1.1 2,1.1
  text "*" at -1.767,0.865 h1.27
Mechanical 15:
  region: -1.477,-2.102 -2.102,-2.102 -2.102,-1.477 -2.352,-1.477 -2.352,1.477 -2.102,1.477 -2.102,2.102 -1.477,2.102 -1.477,2.352 1.477,2.352 1.477,2.102 2.102,2.102 2.102,1.477 2.352,1.477 2.352,-1.477 2.102,-1.477 2.102,-2.102 1.477,-2.102 1.477,-2.352 -1.477,-2.352
  lines w0.152: -2.352,-1.477 -2.102,-1.477 -2.102,-2.102 -1.477,-2.102 -1.477,-2.352 1.477,-2.352 1.477,-2.102 2.102,-2.102 2.102,-1.477 2.352,-1.477 2.352,1.477 2.102,1.477 2.102,2.102 1.477,2.102 1.477,2.352 -1.477,2.352 -1.477,2.102 -2.102,2.102 -2.102,1.477 -2.352,1.477 -2.352,-1.477
3D body: height 0.25, standoff 0, extent 0,0 0.254,0.254
3D body "HCP_24_3_ADI-L.step": height 0.85, standoff 0, extent -2.05,-2.05 2.05,2.05

## LFCSP HCP-24-3-M [mm]
height 0.85
pads (34):
  rect 0.9x0.25 smd paste+0 mask+0: 1(-2,1.25) 2(-2,0.75) 3(-2,0.25) 4(-2,-0.25) 5(-2,-0.75) 6(-2,-1.25) 13(2,-1.25) 14(2,-0.75) 15(2,-0.25) 16(2,0.25) 17(2,0.75) 18(2,1.25)
  rect 0.25x0.9 smd paste+0 mask+0: 7(-1.25,-2) 8(-0.75,-2) 9(-0.25,-2) 10(0.25,-2) 11(0.75,-2) 12(1.25,-2) 19(1.25,2) 20(0.75,2) 21(0.25,2) 22(-0.25,2) 23(-0.75,2) 24(-1.25,2)
  round 0.4 hole 0.3 mask+0: 25(-1,-1) 25(-1,1) 25(-0.8,0) 25(0,-0.8) 25(0,0) 25(0,0.8) 25(0.8,0) 25(1,-1) 25(1,1)
  rect 2.7x2.7 smd paste-1.337 mask+0: 25(0,0)
Bottom Layer:
  rectangle: -1.35,-1.35 1.35,1.35
Top Overlay:
  region: 0.941,2.704 0.56,2.704 0.56,2.958 0.941,2.958
  region: 0.44,-2.704 0.059,-2.704 0.059,-2.958 0.44,-2.958
  lines w0.152: -2.127,-1.708 -2.127,-2.127 -1.708,-2.127 ; -2.127,1.708 -2.127,2.127 -1.708,2.127 ; 1.708,-2.127 2.127,-2.127 2.127,-1.708 ; 1.708,2.127 2.127,2.127 2.127,1.708
  text "*" at -3.702,0.865 h1.27
Top Paste:
  region: 1.25,-0.1 0.1,-0.1 0.1,-1.25 1.25,-1.25
  region: 1.25,1.25 0.1,1.25 0.1,0.1 1.25,0.1
  region: -0.1,-0.1 -1.25,-0.1 -1.25,-1.25 -0.1,-1.25
  region: -0.1,1.25 -1.25,1.25 -1.25,0.1 -0.1,0.1
Mechanical 13:
  lines w0.025: -2,0.73 -0.73,2 ; -2.05,-1.4 -2,-1.4 -2,-1.1 -2.05,-1.1 -2.05,-1.4 ; -2.05,-0.9 -2,-0.9 -2,-0.6 -2.05,-0.6 -2.05,-0.9 ; -2.05,-0.4 -2,-0.4 -2,-0.1 -2.05,-0.1 -2.05,-0.4 ; -2.05,0.1 -2,0.1 -2,0.4 -2.05,0.4 -2.05,0.1 ; -2.05,0.6 -2,0.6 -2,0.9 -2.05,0.9 -2.05,0.6 ; -2.05,1.1 -2,1.1 -2,1.4 -2.05,1.4 -2.05,1.1 ; -2,-2 -2,2 2,2 2,-2 -2,-2 ; -1.4,-2.05 -1.1,-2.05 -1.1,-2 -1.4,-2 -1.4,-2.05 ; -1.4,2 -1.4,2.05 -1.1,2.05 -1.1,2 -1.4,2 ; -0.9,-2.05 -0.6,-2.05 -0.6,-2 -0.9,-2 -0.9,-2.05 ; -0.9,2 -0.9,2.05 -0.6,2.05 -0.6,2 -0.9,2 ; -0.4,-2.05 -0.1,-2.05 -0.1,-2 -0.4,-2 -0.4,-2.05 ; -0.4,2 -0.4,2.05 -0.1,2.05 -0.1,2 -0.4,2 ; 0.1,-2.05 0.4,-2.05 0.4,-2 0.1,-2 0.1,-2.05 ; 0.1,2 0.1,2.05 0.4,2.05 0.4,2 0.1,2 ; 0.6,-2.05 0.9,-2.05 0.9,-2 0.6,-2 0.6,-2.05 ; 0.6,2 0.6,2.05 0.9,2.05 0.9,2 0.6,2 ; 1.1,-2.05 1.4,-2.05 1.4,-2 1.1,-2 1.1,-2.05 ; 1.1,2 1.1,2.05 1.4,2.05 1.4,2 1.1,2 ; 2,-1.4 2.05,-1.4 2.05,-1.1 2,-1.1 2,-1.4 ; 2,-0.9 2.05,-0.9 2.05,-0.6 2,-0.6 2,-0.9 ; 2,-0.4 2.05,-0.4 2.05,-0.1 2,-0.1 2,-0.4 ; 2,0.1 2.05,0.1 2.05,0.4 2,0.4 2,0.1 ; 2,0.6 2.05,0.6 2.05,0.9 2,0.9 2,0.6 ; 2,1.1 2.05,1.1 2.05,1.4 2,1.4 2,1.1
  text "*" at -1.767,0.865 h1.27
Mechanical 15:
  region: -1.883,-2.508 -2.508,-2.508 -2.508,-1.883 -2.958,-1.883 -2.958,1.883 -2.508,1.883 -2.508,2.508 -1.883,2.508 -1.883,2.958 1.883,2.958 1.883,2.508 2.508,2.508 2.508,1.883 2.958,1.883 2.958,-1.883 2.508,-1.883 2.508,-2.508 1.883,-2.508 1.883,-2.958 -1.883,-2.958
  lines w0.152: -2.958,-1.883 -2.958,1.883 -2.508,1.883 -2.508,2.508 -1.883,2.508 -1.883,2.958 1.883,2.958 1.883,2.508 2.508,2.508 2.508,1.883 2.958,1.883 2.958,-1.883 2.508,-1.883 2.508,-2.508 1.883,-2.508 1.883,-2.958 -1.883,-2.958 -1.883,-2.508 -2.508,-2.508 -2.508,-1.883 -2.958,-1.883
3D body "HCP_24_3_ADI-M.step": height 0.85, standoff 0, extent -2.05,-2.05 2.05,2.05
3D body: height 0.25, standoff 0, extent 0,0 0.254,0.254

## LQFP32LD [mm] "TQFP 32 Body 7x7"
height 1.2
pads (32):
  oval 1.65x0.5 smd: 1(-4.2,2.8) 2(-4.2,2) 3(-4.2,1.2) 4(-4.2,0.4) 5(-4.2,-0.4) 6(-4.2,-1.2) 7(-4.2,-2) 8(-4.2,-2.8) 17(4.2,-2.8) 18(4.2,-2) 19(4.2,-1.2) 20(4.2,-0.4) 21(4.2,0.4) 22(4.2,1.2) 23(4.2,2) 24(4.2,2.8)
  oval 0.5x1.65 smd: 9(-2.8,-4.2) 10(-2,-4.2) 11(-1.2,-4.2) 12(-0.4,-4.2) 13(0.4,-4.2) 14(1.2,-4.2) 15(2,-4.2) 16(2.8,-4.2) 25(2.8,4.2) 26(2,4.2) 27(1.2,4.2) 28(0.4,4.2) 29(-0.4,4.2) 30(-1.2,4.2) 31(-2,4.2) 32(-2.8,4.2)
Top Overlay:
  circle w0.25: c-4.2,3.625 r0.125
  circle w0.6: c-1.95,1.95 r0.3
  lines w0.2: -2.95,-2.95 -2.95,2.95 2.95,2.95 2.95,-2.95 -2.95,-2.95
Mechanical 13:
  circle w0.1: c-2.6,2.6 r0.5
  lines w0.1: -3.5,-3.5 -3.5,3.5 3.5,3.5 3.5,-3.5 -3.5,-3.5
Mechanical 15:
  lines w0.1: -0.5,0 0.5,0 ; 0,-0.5 0,0.5 ; -5.25,-5.25 -5.25,5.25 5.25,5.25 5.25,-5.25 -5.25,-5.25
3D body "User Library-FT232BL.STEP": height 1.62, standoff -0.01, extent -4.572,-4.572 4.572,4.572

## MJP-0.2 [mm]
height 2.3
pads (2):
  rect 2.2x2.2 smd: 1(-2.5,0) 2(2.5,0)
Top Overlay:
  lines w0.2: -1,-1.3 1,-1.3 ; -1,1.3 1,1.3
Mechanical 15:
  lines w0.1: -0.5,0 0.5,0 ; 0,-0.5 0,0.5 ; -3.4,-1.3 -3.4,1.3 3.4,1.3 3.4,-1.3 -3.4,-1.3
3D body "MJP-02.STEP": height 2.3, standoff 0, extent -3.24,-0.9 3.24,0.9

## MountHolder 6mm [mm]
pads (1):
  oval 8.5x2 hole 1.2 slot 7.5 at 0 deg: 1(0,0)
Mechanical 15:
  lines w0.254: -5,-0.25 -5,0.25 5,0.25 5,-0.25 -5,-0.25

## Mounting_hole_M3 [mm]
pads (1):
  round 0 hole 3.5 unplated: 5(0,0)
Keep-Out Layer:
  circle w0.254: c0,0 r3.048

## MSOP10-0.5 [mm]
height 1.1
pads (10):
  rect 0.3x1 smd: 1(-1,-2.25) 2(-0.5,-2.25) 3(0,-2.25) 4(0.5,-2.25) 5(1,-2.25) 6(1,2.25) 7(0.5,2.25) 8(0,2.25) 9(-0.5,2.25) 10(-1,2.25)
Top Overlay:
  circle w0.25: c-1.025,-1 r0.125
  lines w0.2: -1.5,-0.517 -1.5,-1.5 1.5,-1.5 1.5,1.5 -1.5,1.5 -1.5,0.517 ; -1.45,-0.498 ccw(c-1.5,0) -1.45,0.498
Mechanical 15:
  lines w0.1: -0.5,0 0.5,0 ; 0,-0.5 0,0.5
3D body "User Library-TSSOP-10.step": height 1.1, standoff 0, extent -1.5,-2.5 1.5,2.5

## MTS-202 [mm]
height 20
pads (6):
  rect 3x3 hole 2.2: 1(-2.4,4.699)
  round 3 hole 2.2: 2(-2.4,0) 3(-2.4,-4.699) 4(2.4,-4.699) 5(2.4,0) 6(2.4,4.699)
Top Overlay:
  lines w0.254: -6.35,6.599 -6.35,-6.599 6.35,-6.599 ; -6.35,6.609 6.35,6.609 ; 6.4,-6.591 6.4,6.609
Mechanical 7:
  lines w0.15: 0,-0.75 0,0.75
Mechanical 15:
  lines w0.15: -0.75,0 0.75,0
  lines w0.254: -6.4,-6.6 6.4,-6.6 6.4,6.6 -6.4,6.6 -6.4,-6.6
3D body "User Library-MTS-20x-A2.step": height 28.34, standoff -6.3, extent -6.25,-6.6 6.45,6.6

## MYG7 [mm]
height 10
pads (2):
  round 1.5 hole 0.8: 1(0,0) 2(5,-2.5)
Top Overlay:
  lines w0.254: -1.5,0.5 -1.5,-3.25 4,-3.25 ; 1,0.75 6.5,0.75 6.5,-3
Mechanical 13:
  lines w0.178: -1.5,-3.25 6.5,-3.25 6.5,0.75 -1.5,0.75 -1.5,-3.25
3D body: height 8.99, standoff 1.01, extent -1.468,-3.25 6.5,0.75